# Altium footprint library Pcblib.PcbLib: 281 footprints (part 1 of 18)
Each footprint in its own frame and in the unit in brackets; x right, y up, seen from the top. Pads: shape width x height; smd on the part's side, far side on the other; paste and mask are expansions set on the pad; w line width, h text height; cw(c..) or ccw(c..) is an arc to the next point about the centre after c.
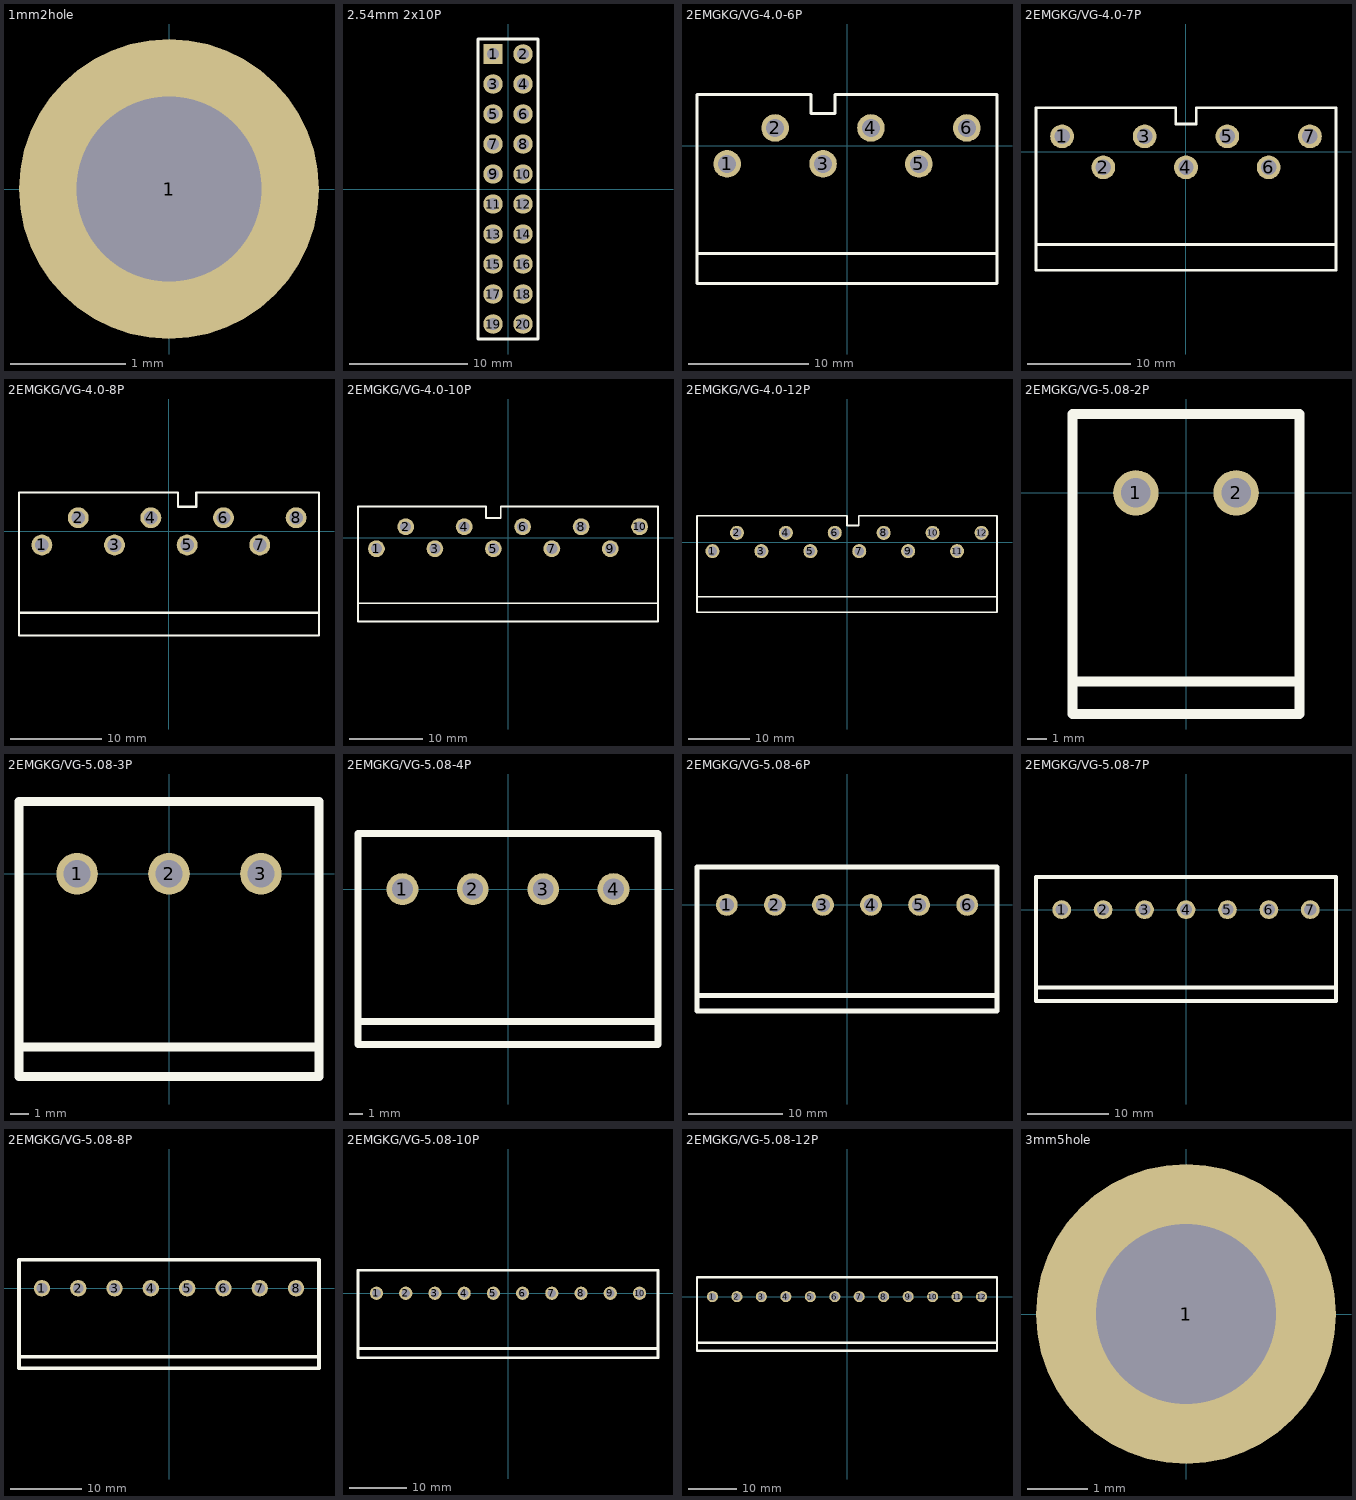
[diagram p0: the footprints below, top view; thin cyan lines are the x and y axes]

## 1mm2hole [mm]
height 5.6
pads (1):
  round 2.6 hole 1.6: 1(0,0)

## 2.54mm 2x10P [mil]
pads (20):
  rect 65x65 hole 40: 1(-50,450)
  round 65 hole 40: 2(50,450) 3(-50,350) 4(50,350) 5(-50,250) 6(50,250) 7(-50,150) 8(50,150) 9(-50,50) 10(50,50) 11(-50,-50) 12(50,-50) 13(-50,-150) 14(50,-150) 15(-50,-250) 16(50,-250) 17(-50,-350) 18(50,-350) 19(-50,-450) 20(50,-450)
Top Overlay:
  lines w10: -100,-500 100,-500 100,500 -100,500 -100,-500

## 2EMGKG/VG-4.0-6P [mm]
pads (6):
  round 2.3 hole 1.5: 1(-10,-1.5) 2(-6,1.5) 3(-2,-1.5) 4(2,1.5) 5(6,-1.5) 6(10,1.5)
Top Overlay:
  lines w0.254: -12.52,-8.97 12.52,-8.97 ; -12.52,-11.47 -12.52,4.28 -3,4.28 -3,2.7 -1,2.7 -1,4.28 12.52,4.28 12.52,-11.47 -12.52,-11.47

## 2EMGKG/VG-4.0-7P [mm]
pads (7):
  round 2.3 hole 1.5: 1(-12,1.5) 2(-8,-1.5) 3(-4,1.5) 4(0,-1.5) 5(4,1.5) 6(8,-1.5) 7(12,1.5)
Top Overlay:
  lines w0.254: -14.52,-8.97 14.52,-8.97 ; -14.52,-11.47 -14.52,4.28 -1,4.28 -1,2.7 1,2.7 1,4.28 14.52,4.28 14.52,-11.47 -14.52,-11.47

## 2EMGKG/VG-4.0-8P [mm]
pads (8):
  round 2.3 hole 1.5: 1(-14,-1.5) 2(-10,1.5) 3(-6,-1.5) 4(-2,1.5) 5(2,-1.5) 6(6,1.5) 7(10,-1.5) 8(14,1.5)
Top Overlay:
  lines w0.254: -16.52,-8.97 16.52,-8.97 ; -16.52,-11.47 16.52,-11.47 16.52,4.28 3,4.28 3,2.7 1,2.7 1,4.28 -16.52,4.28 -16.52,-11.47

## 2EMGKG/VG-4.0-10P [mm]
pads (10):
  round 2.3 hole 1.5: 1(-18,-1.5) 2(-14,1.5) 3(-10,-1.5) 4(-6,1.5) 5(-2,-1.5) 6(2,1.5) 7(6,-1.5) 8(10,1.5) 9(14,-1.5) 10(18,1.5)
Top Overlay:
  lines w0.254: -20.52,-8.97 20.52,-8.97 ; -20.52,-11.47 20.52,-11.47 20.52,4.28 -1,4.28 -1,2.7 -3,2.7 -3,4.28 -20.52,4.28 -20.52,-11.47

## 2EMGKG/VG-4.0-12P [mm]
pads (12):
  round 2.3 hole 1.5: 1(-22,-1.5) 2(-18,1.5) 3(-14,-1.5) 4(-10,1.5) 5(-6,-1.5) 6(-2,1.5) 7(2,-1.5) 8(6,1.5) 9(10,-1.5) 10(14,1.5) 11(18,-1.5) 12(22,1.5)
Top Overlay:
  lines w0.254: -24.52,-8.97 24.52,-8.97 ; -24.52,-11.47 24.52,-11.47 24.52,4.28 1.956,4.28 1.956,2.7 0,2.7 0,4.28 -24.52,4.28 -24.52,-11.47

## 2EMGKG/VG-5.08-2P [mm]
pads (2):
  round 2.3 hole 1.5: 1(-2.54,0) 2(2.54,0)
Top Overlay:
  lines w0.508: -5.75,-9.57 5.75,-9.57 ; -5.75,-11.21 5.75,-11.21 5.75,4 -5.75,4 -5.75,-11.21

## 2EMGKG/VG-5.08-3P [mm]
pads (3):
  round 2.3 hole 1.5: 1(-5.08,0) 2(0,0) 3(5.08,0)
Top Overlay:
  lines w0.508: -8.29,-9.57 8.29,-9.57 ; -8.29,-11.21 -8.29,4 8.29,4 8.29,-11.21 -8.29,-11.21

## 2EMGKG/VG-5.08-4P [mm]
pads (4):
  round 2.3 hole 1.5: 1(-7.62,0) 2(-2.54,0) 3(2.54,0) 4(7.62,0)
Top Overlay:
  lines w0.508: -10.83,-9.57 10.83,-9.57 ; -10.83,-11.21 -10.83,4 10.83,4 10.83,-11.21 -10.83,-11.21

## 2EMGKG/VG-5.08-6P [mm]
pads (6):
  round 2.3 hole 1.5: 1(-12.7,0) 2(-7.62,0) 3(-2.54,0) 4(2.54,0) 5(7.62,0) 6(12.7,0)
Top Overlay:
  lines w0.508: -15.85,-9.57 15.85,-9.57 ; -15.85,-11.21 -15.85,4 15.85,4 15.85,-11.21 -15.85,-11.21

## 2EMGKG/VG-5.08-7P [mm]
pads (7):
  round 2.3 hole 1.5: 1(-15.24,0) 2(-10.16,0) 3(-5.08,0) 4(0,0) 5(5.08,0) 6(10.16,0) 7(15.24,0)
Top Overlay:
  lines w0.508: -18.39,-9.57 18.39,-9.57 ; -18.39,-11.21 18.39,-11.21 18.39,4 -18.39,4 -18.39,-11.21

## 2EMGKG/VG-5.08-8P [mm]
pads (8):
  round 2.3 hole 1.5: 1(-17.78,0) 2(-12.7,0) 3(-7.62,0) 4(-2.54,0) 5(2.54,0) 6(7.62,0) 7(12.7,0) 8(17.78,0)
Top Overlay:
  lines w0.508: -20.99,-9.57 20.99,-9.57 ; -20.99,-11.21 20.99,-11.21 20.99,4 -20.99,4 -20.99,-11.21

## 2EMGKG/VG-5.08-10P [mm]
pads (10):
  round 2.3 hole 1.5: 1(-22.86,0) 2(-17.78,0) 3(-12.7,0) 4(-7.62,0) 5(-2.54,0) 6(2.54,0) 7(7.62,0) 8(12.7,0) 9(17.78,0) 10(22.86,0)
Top Overlay:
  lines w0.508: -26.07,-9.57 26.07,-9.57 ; -26.07,-11.21 -26.07,4 26.07,4 26.07,-11.21 -26.07,-11.21

## 2EMGKG/VG-5.08-12P [mm]
pads (12):
  round 2.3 hole 1.5: 1(-27.94,0) 2(-22.86,0) 3(-17.78,0) 4(-12.7,0) 5(-7.62,0) 6(-2.54,0) 7(2.54,0) 8(7.62,0) 9(12.7,0) 10(17.78,0) 11(22.86,0) 12(27.94,0)
Top Overlay:
  lines w0.508: -31.15,-9.57 31.15,-9.57 ; -31.15,-11.21 31.15,-11.21 31.15,4 -31.15,4 -31.15,-11.21

## 3mm5hole [mm]
height 5.6
pads (1):
  round 5 hole 3: 1(0,0)